# Altium footprint library 3M THD.PcbLib: 163 footprints (part 13 of 14)
Each footprint in its own frame and in the unit in brackets; x right, y up, seen from the top. Pads: shape width x height; smd on the part's side, far side on the other; paste and mask are expansions set on the pad; w line width, h text height; cw(c..) or ccw(c..) is an arc to the next point about the centre after c.
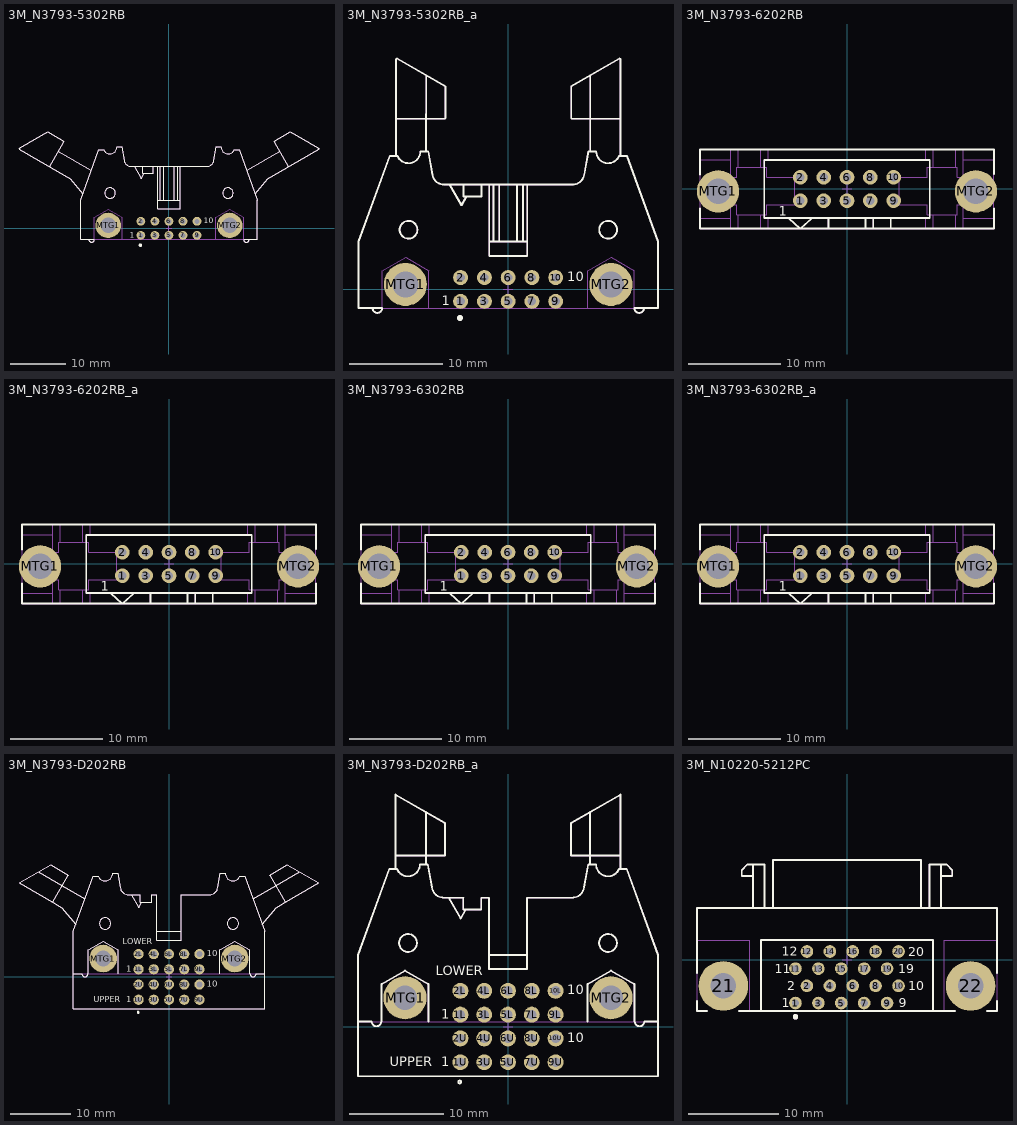
[diagram p12: the footprints below, top view; thin cyan lines are the x and y axes]

## 3M_N3793-5302RB [mm] "3M, 3000 Series, 10 Contacts - Pitch 2.54mm - Right Angle Four-Wall Header (Black) With Long Roll Pin Latch/Ejectors"
height 8.6
pads (12):
  round 1.6 hole 0.9: 1(-5.08,-1.27) 2(-5.08,1.27) 3(-2.54,-1.27) 4(-2.54,1.27) 5(0,-1.27) 6(0,1.27) 7(2.54,-1.27) 8(2.54,1.27) 9(5.08,-1.27) 10(5.08,1.27)
  round 4.6 hole 2.8: MTG1(-10.985,0.53) MTG2(10.985,0.53)
Top Overlay:
  circle w0.2: c10.681,6.375 r0.953
  circle w0.2: c-10.655,6.375 r0.953
  circle w0.35: c-5.153,-3.048 r0.15
  lines w0.2: -21.594,11.145 -19.016,15.611 ccw(c-19.104,15.662) -19.053,15.75 -21.968,17.432 -27.073,14.485 ccw(c-27.022,14.397) -27.073,14.309 -17.886,9.005 -15.575,6.25 ; -19.981,13.939 -14.028,10.502 ; -14.491,-2 ccw(c-13.983,-2) -13.475,-2 ; -13.5,-2.007 -15.989,-2.007 -15.989,5.105 -12.661,14.249 -11.819,14.249 ccw(c-10.655,14.757) -9.385,14.757 -8.543,14.757 -8.101,12.251 ccw(c-6.851,12.471) -6.851,11.201 6.876,11.201 ccw(c6.876,12.471) 8.127,12.251 8.569,14.757 9.411,14.757 ccw(c10.681,14.757) 11.845,14.249 12.687,14.249 16.015,5.105 16.015,-2.007 13.5,-2.007 ; -6.267,11.201 -4.997,9.002 -4.461,9.931 ; -4.769,11.201 -4.769,9.931 -2.851,9.931 -2.851,11.201 ; -2.019,5.105 2.045,5.105 ; -2.019,11.201 -2.019,3.581 2.045,3.581 2.045,11.201 ; -1.587,5.105 -1.587,11.201 -0.953,11.201 -0.953,5.105 ; 0.953,5.105 0.953,11.201 1.587,11.201 1.587,5.105 ; 13.492,-2.007 ccw(c14,-2.007) 14.508,-2.007 ; 14.051,10.502 20.004,13.939 ; 15.598,6.25 17.909,9.005 27.096,14.309 ccw(c27.045,14.397) 27.096,14.485 21.991,17.432 19.076,15.75 ccw(c19.127,15.662) 19.039,15.611 21.617,11.145
  text "10" at 6.34,0.889 h1.02
  text "1" at -7.112,-1.7 h1.02
Mechanical 8:
  lines w0.05: -11.485,0.53 -10.985,0.53 ; -10.985,0.03 -10.985,0.53 ; -10.985,1.03 -10.985,0.53 ; -10.485,0.53 -10.985,0.53 ; -5.58,-1.27 -5.08,-1.27 ; -5.58,1.27 -5.08,1.27 ; -5.08,-1.77 -5.08,-1.27 ; -5.08,-0.77 -5.08,-1.27 ; -5.08,0.77 -5.08,1.27 ; -5.08,1.77 -5.08,1.27 ; -4.58,-1.27 -5.08,-1.27 ; -4.58,1.27 -5.08,1.27 ; -3.04,-1.27 -2.54,-1.27 ; -3.04,1.27 -2.54,1.27 ; -2.54,-1.77 -2.54,-1.27 ; -2.54,-0.77 -2.54,-1.27 ; -2.54,0.77 -2.54,1.27 ; -2.54,1.77 -2.54,1.27 ; -2.04,-1.27 -2.54,-1.27 ; -2.04,1.27 -2.54,1.27 ; -0.5,-1.27 0,-1.27 ; -0.5,0 0,0 ; -0.5,1.27 0,1.27 ; 0,-1.77 0,-1.27 ; 0,-0.77 0,-1.27 ; 0,-0.5 0,0 ; 0,0.5 0,0 ; 0,0.77 0,1.27 ; 0,1.77 0,1.27 ; 0.5,-1.27 0,-1.27 ; 0.5,0 0,0 ; 0.5,1.27 0,1.27 ; 2.04,-1.27 2.54,-1.27 ; 2.04,1.27 2.54,1.27 ; 2.54,-1.77 2.54,-1.27 ; 2.54,-0.77 2.54,-1.27 ; 2.54,0.77 2.54,1.27 ; 2.54,1.77 2.54,1.27 ; 3.04,-1.27 2.54,-1.27 ; 3.04,1.27 2.54,1.27 ; 4.58,-1.27 5.08,-1.27 ; 4.58,1.27 5.08,1.27 ; 5.08,-1.77 5.08,-1.27 ; 5.08,-0.77 5.08,-1.27 ; 5.08,0.77 5.08,1.27 ; 5.08,1.77 5.08,1.27 ; 5.58,-1.27 5.08,-1.27 ; 5.58,1.27 5.08,1.27 ; 10.485,0.53 10.985,0.53 ; 10.985,0.03 10.985,0.53 ; 10.985,1.03 10.985,0.53 ; 11.485,0.53 10.985,0.53
Mechanical 14:
  circle w0.1: c10.681,6.375 r0.953
  circle w0.1: c-10.655,6.375 r0.953
  circle w0.1: c10.998,0.533 r1.27
  circle w0.1: c-10.973,0.533 r1.27
  lines w0.1: -21.594,11.145 -19.016,15.611 ccw(c-19.104,15.662) -19.053,15.75 -21.968,17.432 -27.073,14.485 ccw(c-27.022,14.397) -27.073,14.309 -17.886,9.005 -15.575,6.25 ; -19.981,13.939 -14.028,10.502 ; -16.052,-2.007 16.015,-2.007 16.015,5.105 12.687,14.249 11.845,14.249 cw(c10.681,14.757) 9.411,14.757 8.569,14.757 8.127,12.251 cw(c6.876,12.471) 6.876,11.201 -6.851,11.201 cw(c-6.851,12.471) -8.101,12.251 -8.543,14.757 -9.385,14.757 cw(c-10.655,14.757) -11.819,14.249 -12.661,14.249 -15.989,5.105 -15.989,-2.007 ; -14.491,-2.007 ccw(c-13.983,-2.007) -13.475,-2.007 -13.475,1.978 -10.973,3.422 -8.471,1.978 -8.471,-2.007 ; -6.267,11.201 -4.997,9.002 -4.461,9.931 ; -4.769,11.201 -4.769,9.931 -2.851,9.931 -2.851,11.201 ; -2.019,5.105 2.045,5.105 ; -2.019,11.201 -2.019,3.581 2.045,3.581 2.045,11.201 ; -1.587,5.105 -1.587,11.201 -0.953,11.201 -0.953,5.105 ; 0.953,5.105 0.953,11.201 1.587,11.201 1.587,5.105 ; 8.496,-2.007 8.496,1.978 10.998,3.422 13.5,1.978 13.5,-2.007 ; 13.475,-2.007 ccw(c13.983,-2.007) 14.491,-2.007 ; 13.538,-2.007 ccw(c14.046,-2.007) 14.554,-2.007 ; 14.051,10.502 20.004,13.939 ; 15.598,6.25 17.909,9.005 27.096,14.309 ccw(c27.045,14.397) 27.096,14.485 21.991,17.432 19.076,15.75 ccw(c19.127,15.662) 19.039,15.611 21.617,11.145
  text "1" at -7.112,-1.7 h1.02
  text "10" at 6.34,0.889 h1.02
3D body "3M_N3793-5302RB.stp": height 8.64, standoff -2.84, extent -27.116,-2.514 27.141,17.448

## 3M_N3793-5302RB_a [mm] "3M, 3000 Series, 10 Contacts - Pitch 2.54mm - Right Angle Four-Wall Header (Black) With Long Roll Pin Latch/Ejectors"
height 8.6
pads (12):
  round 1.6 hole 0.9: 1(-5.08,-1.27) 2(-5.08,1.27) 3(-2.54,-1.27) 4(-2.54,1.27) 5(0,-1.27) 6(0,1.27) 7(2.54,-1.27) 8(2.54,1.27) 9(5.08,-1.27) 10(5.08,1.27)
  round 4.6 hole 2.8: MTG1(-10.985,0.53) MTG2(10.985,0.53)
Top Overlay:
  circle w0.2: c-10.655,6.375 r0.953
  circle w0.2: c10.681,6.375 r0.953
  circle w0.35: c-5.153,-3.048 r0.15
  lines w0.2: -14.491,-2 ccw(c-13.983,-2) -13.475,-2 ; -13.513,-2.007 -15.989,-2.007 -15.989,5.105 -12.661,14.249 -11.819,14.249 ccw(c-10.655,14.757) -9.385,14.757 -8.543,14.757 -8.101,12.251 ccw(c-6.851,12.471) -6.851,11.201 6.876,11.201 ccw(c6.876,12.471) 8.127,12.251 8.569,14.757 9.411,14.757 ccw(c10.681,14.757) 11.845,14.249 12.687,14.249 16.015,5.105 16.015,-2.007 13.5,-2.007 ; -11.976,14.249 -11.976,24.561 cw(c-11.874,24.561) -11.824,24.649 -6.718,21.702 -6.718,18.336 cw(c-6.82,18.336) -6.82,18.235 -11.976,18.235 ; -8.774,14.757 -8.75,22.875 ; -6.267,11.201 -4.997,9.002 -4.461,9.931 ; -4.769,11.201 -4.769,9.931 -2.851,9.931 -2.851,11.201 ; -2.019,5.105 2.045,5.105 ; -2.019,11.201 -2.019,3.581 2.045,3.581 2.045,11.201 ; -1.587,5.105 -1.587,11.201 -0.953,11.201 -0.953,5.105 ; 0.953,5.105 0.953,11.201 1.587,11.201 1.587,5.105 ; 8.776,14.757 8.776,22.875 ; 12.002,14.249 12.002,24.561 ccw(c11.9,24.561) 11.849,24.649 6.744,21.702 6.744,18.336 ccw(c6.845,18.336) 6.845,18.235 12.002,18.235 ; 13.492,-2.007 ccw(c14,-2.007) 14.508,-2.007
  text "1" at -7.112,-1.7 h1.02
  text "10" at 6.34,0.889 h1.02
Mechanical 8:
  lines w0.05: -11.485,0.53 -10.985,0.53 ; -10.985,0.03 -10.985,0.53 ; -10.985,1.03 -10.985,0.53 ; -10.485,0.53 -10.985,0.53 ; -5.58,-1.27 -5.08,-1.27 ; -5.58,1.27 -5.08,1.27 ; -5.08,-1.77 -5.08,-1.27 ; -5.08,-0.77 -5.08,-1.27 ; -5.08,0.77 -5.08,1.27 ; -5.08,1.77 -5.08,1.27 ; -4.58,-1.27 -5.08,-1.27 ; -4.58,1.27 -5.08,1.27 ; -3.04,-1.27 -2.54,-1.27 ; -3.04,1.27 -2.54,1.27 ; -2.54,-1.77 -2.54,-1.27 ; -2.54,-0.77 -2.54,-1.27 ; -2.54,0.77 -2.54,1.27 ; -2.54,1.77 -2.54,1.27 ; -2.04,-1.27 -2.54,-1.27 ; -2.04,1.27 -2.54,1.27 ; -0.5,-1.27 0,-1.27 ; -0.5,0 0,0 ; -0.5,1.27 0,1.27 ; 0,-1.77 0,-1.27 ; 0,-0.77 0,-1.27 ; 0,-0.5 0,0 ; 0,0.5 0,0 ; 0,0.77 0,1.27 ; 0,1.77 0,1.27 ; 0.5,-1.27 0,-1.27 ; 0.5,0 0,0 ; 0.5,1.27 0,1.27 ; 2.04,-1.27 2.54,-1.27 ; 2.04,1.27 2.54,1.27 ; 2.54,-1.77 2.54,-1.27 ; 2.54,-0.77 2.54,-1.27 ; 2.54,0.77 2.54,1.27 ; 2.54,1.77 2.54,1.27 ; 3.04,-1.27 2.54,-1.27 ; 3.04,1.27 2.54,1.27 ; 4.58,-1.27 5.08,-1.27 ; 4.58,1.27 5.08,1.27 ; 5.08,-1.77 5.08,-1.27 ; 5.08,-0.77 5.08,-1.27 ; 5.08,0.77 5.08,1.27 ; 5.08,1.77 5.08,1.27 ; 5.58,-1.27 5.08,-1.27 ; 5.58,1.27 5.08,1.27 ; 10.485,0.53 10.985,0.53 ; 10.985,0.03 10.985,0.53 ; 10.985,1.03 10.985,0.53 ; 11.485,0.53 10.985,0.53
Mechanical 14:
  circle w0.1: c-10.973,0.533 r1.27
  circle w0.1: c10.998,0.533 r1.27
  circle w0.1: c-10.655,6.375 r0.953
  circle w0.1: c10.681,6.375 r0.953
  lines w0.1: -16.052,-2.007 16.015,-2.007 16.015,5.105 12.687,14.249 11.845,14.249 cw(c10.681,14.757) 9.411,14.757 8.569,14.757 8.127,12.251 cw(c6.876,12.471) 6.876,11.201 -6.851,11.201 cw(c-6.851,12.471) -8.101,12.251 -8.543,14.757 -9.385,14.757 cw(c-10.655,14.757) -11.819,14.249 -12.661,14.249 -15.989,5.105 -15.989,-2.007 ; -14.491,-2.007 ccw(c-13.983,-2.007) -13.475,-2.007 -13.475,1.978 -10.973,3.422 -8.471,1.978 -8.471,-2.007 ; -11.976,14.249 -11.976,24.561 cw(c-11.874,24.561) -11.824,24.649 -6.718,21.702 -6.718,18.336 cw(c-6.82,18.336) -6.82,18.235 -11.976,18.235 ; -8.774,14.757 -8.75,22.875 ; -6.267,11.201 -4.997,9.002 -4.461,9.931 ; -4.769,11.201 -4.769,9.931 -2.851,9.931 -2.851,11.201 ; -4.559,-2.007 7.125,-2.007 ; -2.019,5.105 2.045,5.105 ; -2.019,11.201 -2.019,3.581 2.045,3.581 2.045,11.201 ; -1.587,5.105 -1.587,11.201 -0.953,11.201 -0.953,5.105 ; 0.953,5.105 0.953,11.201 1.587,11.201 1.587,5.105 ; 8.496,-2.007 8.496,1.978 10.998,3.422 13.5,1.978 13.5,-2.007 ; 8.776,14.757 8.776,22.875 ; 12.002,14.249 12.002,24.561 ccw(c11.9,24.561) 11.849,24.649 6.744,21.702 6.744,18.336 ccw(c6.845,18.336) 6.845,18.235 12.002,18.235 ; 13.475,-2.007 ccw(c13.983,-2.007) 14.491,-2.007 ; 13.538,-2.007 ccw(c14.046,-2.007) 14.554,-2.007
  text "10" at 6.34,0.889 h1.02
  text "1" at -7.112,-1.7 h1.02
3D body "3M_N3793-5302RB_a.stp": height 8.64, standoff -2.84, extent -16.002,-2.514 16.002,24.674

## 3M_N3793-6202RB [mm] "3M, 3000 Series, 10 Contacts - Pitch 2.54mm - Straight Four-Wall Header (Black) With Short Roll Pin Latch/Ejectors"
height 24.6
pads (12):
  round 1.6 hole 0.9: 1(-5.08,-1.27) 2(-5.08,1.27) 3(-2.54,-1.27) 4(-2.54,1.27) 5(0,-1.27) 6(0,1.27) 7(2.54,-1.27) 8(2.54,1.27) 9(5.08,-1.27) 10(5.08,1.27)
  round 4.6 hole 2.8: MTG1(-14.034,-0.256) MTG2(14.034,-0.252)
Top Overlay:
  lines w0.2: -15.998,-2.109 -15.998,-4.318 15.998,-4.318 15.998,-2.104 ; -15.998,1.596 -15.998,4.318 15.998,4.318 15.998,1.601 ; -6.35,-3.175 -5.08,-4.318 -3.81,-3.175 ; -2.03,-4.318 -2.03,-3.174 ; 2.032,-4.318 2.032,-3.174 ; 2.851,-4.318 2.851,-3.174 ; 4.767,-4.318 4.767,-3.174 ; -9.015,-3.174 -9.015,3.176 9.015,3.176 9.015,-3.174 -9.015,-3.174
  text "1" at -7.417,-2.921 h1.02
Mechanical 8:
  lines w0.1: -14.534,-0.256 -14.034,-0.256 ; -14.034,-0.756 -14.034,-0.256 ; -14.034,0.244 -14.034,-0.256 ; -13.534,-0.256 -14.034,-0.256 ; -5.58,-1.27 -5.08,-1.27 ; -5.58,1.27 -5.08,1.27 ; -5.08,-1.77 -5.08,-1.27 ; -5.08,-0.77 -5.08,-1.27 ; -5.08,0.77 -5.08,1.27 ; -5.08,1.77 -5.08,1.27 ; -4.58,-1.27 -5.08,-1.27 ; -4.58,1.27 -5.08,1.27 ; -3.04,-1.27 -2.54,-1.27 ; -3.04,1.27 -2.54,1.27 ; -2.54,-1.77 -2.54,-1.27 ; -2.54,-0.77 -2.54,-1.27 ; -2.54,0.77 -2.54,1.27 ; -2.54,1.77 -2.54,1.27 ; -2.04,-1.27 -2.54,-1.27 ; -2.04,1.27 -2.54,1.27 ; -0.5,-1.27 0,-1.27 ; -0.5,0 0,0 ; -0.5,1.27 0,1.27 ; 0,-1.77 0,-1.27 ; 0,-0.77 0,-1.27 ; 0,-0.5 0,0 ; 0,0.5 0,0 ; 0,0.77 0,1.27 ; 0,1.77 0,1.27 ; 0.5,-1.27 0,-1.27 ; 0.5,0 0,0 ; 0.5,1.27 0,1.27 ; 2.04,-1.27 2.54,-1.27 ; 2.04,1.27 2.54,1.27 ; 2.54,-1.77 2.54,-1.27 ; 2.54,-0.77 2.54,-1.27 ; 2.54,0.77 2.54,1.27 ; 2.54,1.77 2.54,1.27 ; 3.04,-1.27 2.54,-1.27 ; 3.04,1.27 2.54,1.27 ; 4.58,-1.27 5.08,-1.27 ; 4.58,1.27 5.08,1.27 ; 5.08,-1.77 5.08,-1.27 ; 5.08,-0.77 5.08,-1.27 ; 5.08,0.77 5.08,1.27 ; 5.08,1.77 5.08,1.27 ; 5.58,-1.27 5.08,-1.27 ; 5.58,1.27 5.08,1.27 ; 13.534,-0.252 14.034,-0.252 ; 14.034,-0.752 14.034,-0.252 ; 14.034,0.248 14.034,-0.252 ; 14.534,-0.252 14.034,-0.252
Mechanical 14:
  lines w0.1: -15.998,-4.318 -15.998,4.318 ; -15.998,-4.318 15.998,-4.318 ; -15.998,-4.318 -15.998,4.318 ; -15.998,-4.318 15.998,-4.318 ; -15.998,4.318 15.998,4.318 ; -15.998,4.318 15.998,4.318 ; -15.553,-1.133 -15.553,0.628 ; -15.553,-1.133 -14.719,-1.615 -15.553,-1.133 ; -15.553,-1.133 -15.553,0.628 ; -15.553,0.628 -14.719,1.109 -15.553,0.628 ; -14.719,-1.727 -14.719,1.271 ; -14.719,-1.727 -11.985,-1.727 ; -14.719,-1.727 -14.719,1.271 ; -14.719,-1.727 -11.985,-1.727 ; -14.719,1.271 -11.985,1.271 ; -14.719,1.271 -11.985,1.271 ; -14.031,-2.014 -14.526,-1.727 -14.031,-2.014 ; -14.031,-2.014 -13.535,-1.727 -14.031,-2.014 ; -14.031,1.507 -13.622,1.271 -14.031,1.507 ; -14.031,1.507 -14.439,1.271 -14.031,1.507 ; -11.985,-2.819 -11.985,-1.727 ; -11.985,-2.819 -8.759,-2.819 ; -11.985,-2.819 -11.985,-1.727 ; -11.985,-2.819 -8.759,-2.819 ; -11.985,1.271 -11.985,2.362 ; -11.985,1.271 -11.985,2.362 ; -11.985,2.362 -8.763,2.362 -11.985,2.362 ; -9.015,-3.174 9.015,-3.174 ; -9.015,-3.174 -9.015,-2.819 -9.015,-3.174 ; -9.015,-3.174 9.015,-3.174 ; -9.015,3.176 9.015,3.176 ; -9.015,3.176 -9.015,2.362 -9.015,3.176 ; -9.015,3.176 9.015,3.176 ; -8.759,-2.819 -8.759,-1.727 ; -8.759,-2.819 -8.759,-1.727 ; -8.759,-1.727 -5.713,-1.727 ; -8.759,-1.727 -5.713,-1.727 ; -8.759,1.271 -8.759,2.362 -8.759,1.271 ; -8.759,1.271 -5.713,1.271 ; -8.759,1.271 -5.713,1.271 ; -5.713,-1.727 -5.713,1.271 ; -5.713,-1.727 -5.713,1.271 ; 5.713,-1.727 5.713,1.271 ; 5.713,-1.727 8.759,-1.727 ; 5.713,-1.727 5.713,1.271 ; 5.713,-1.727 8.759,-1.727 ; 5.713,1.271 8.759,1.271 ; 5.713,1.271 8.759,1.271 ; 8.759,-2.819 8.759,-1.727 ; 8.759,-2.819 11.985,-2.819 ; 8.759,-2.819 8.759,-1.727 ; 8.759,-2.819 11.985,-2.819 ; 8.759,1.271 8.759,2.362 ; 8.759,1.271 8.759,2.362 ; 8.759,2.362 11.985,2.362 ; 8.759,2.362 11.985,2.362 ; 9.015,-3.174 9.015,-2.819 9.015,-3.174 ; 9.015,3.176 9.015,2.362 9.015,3.176 ; 11.985,-2.819 11.985,-1.727 ; 11.985,-2.819 11.985,-1.727 ; 11.985,-1.727 14.719,-1.727 ; 11.985,-1.727 14.719,-1.727 ; 11.985,1.271 11.985,2.362 ; 11.985,1.271 14.719,1.271 ; 11.985,1.271 11.985,2.362 ; 11.985,1.271 14.719,1.271 ; 14.031,-2.014 14.526,-1.727 14.031,-2.014 ; 14.031,-2.014 13.535,-1.727 14.031,-2.014 ; 14.031,1.507 13.622,1.271 14.031,1.507 ; 14.031,1.507 14.439,1.271 14.031,1.507 ; 14.719,-1.727 14.719,1.271 ; 14.719,-1.727 14.719,1.271 ; 15.553,-1.133 15.553,0.628 ; 15.553,-1.133 14.719,-1.615 15.553,-1.133 ; 15.553,-1.133 15.553,0.628 ; 15.553,0.628 14.719,1.109 15.553,0.628 ; 15.998,-4.318 15.998,4.318 ; 15.998,-4.318 15.998,4.318 ; -15.998,-3.174 -12.67,-3.174 -15.998,-3.174 ; -15.998,3.176 -12.67,3.176 -15.998,3.176 ; -12.67,-4.318 -12.67,-1.727 -12.67,-4.318 ; -12.67,1.271 -12.67,4.318 -12.67,1.271 ; -11.831,-4.318 -11.831,-2.819 -11.831,-4.318 ; -11.831,2.362 -11.831,4.318 -11.831,2.362 ; -9.395,-4.318 -9.395,-2.819 -9.395,-4.318 ; -9.395,2.362 -9.395,4.318 -9.395,2.362 ; -8.553,-4.318 -8.553,-3.174 -8.553,-4.318 ; -8.553,3.176 -8.553,4.318 -8.553,3.176 ; -2.03,-4.318 -2.03,-3.174 -2.03,-4.318 ; 2.032,-4.318 2.032,-3.174 2.032,-4.318 ; 2.851,-4.318 2.851,-3.174 2.851,-4.318 ; 4.767,-4.318 4.767,-3.174 4.767,-4.318 ; 8.553,-4.318 8.553,-3.174 8.553,-4.318 ; 8.553,3.176 8.553,4.318 8.553,3.176 ; 9.395,-4.318 9.395,-2.819 9.395,-4.318 ; 9.395,2.362 9.395,4.318 9.395,2.362 ; 11.831,-4.318 11.831,-2.819 11.831,-4.318 ; 11.831,2.362 11.831,4.318 11.831,2.362 ; 12.67,-4.318 12.67,-1.727 12.67,-4.318 ; 12.67,-3.174 15.998,-3.174 12.67,-3.174 ; 12.67,1.271 12.67,4.318 12.67,1.271 ; 12.67,3.176 15.998,3.176 12.67,3.176
3D body "3M_N3793-6202RB.stp": height 18.69, standoff -2.84, extent -24.931,-4.318 24.931,4.318

## 3M_N3793-6202RB_a [mm] "3M, 3000 Series, 10 Contacts - Pitch 2.54mm - Straight Four-Wall Header (Black) With Short Roll Pin Latch/Ejectors"
height 24.6
pads (12):
  round 1.6 hole 0.9: 1(-5.08,-1.27) 2(-5.08,1.27) 3(-2.54,-1.27) 4(-2.54,1.27) 5(0,-1.27) 6(0,1.27) 7(2.54,-1.27) 8(2.54,1.27) 9(5.08,-1.27) 10(5.08,1.27)
  round 4.6 hole 2.8: MTG1(-14.034,-0.256) MTG2(14.034,-0.252)
Top Overlay:
  lines w0.2: -15.998,-2.109 -15.998,-4.318 15.998,-4.318 15.998,-2.104 ; -15.998,1.596 -15.998,4.318 15.998,4.318 15.998,1.601 ; -6.35,-3.175 -5.08,-4.318 -3.81,-3.175 ; -2.03,-4.318 -2.03,-3.174 ; 2.032,-4.318 2.032,-3.174 ; 2.851,-4.318 2.851,-3.174 ; 4.767,-4.318 4.767,-3.174 ; -9.015,-3.174 -9.015,3.176 9.015,3.176 9.015,-3.174 -9.015,-3.174
  text "1" at -7.417,-2.921 h1.02
Mechanical 8:
  lines w0.1: -14.534,-0.256 -14.034,-0.256 ; -14.034,-0.756 -14.034,-0.256 ; -14.034,0.244 -14.034,-0.256 ; -13.534,-0.256 -14.034,-0.256 ; -5.58,-1.27 -5.08,-1.27 ; -5.58,1.27 -5.08,1.27 ; -5.08,-1.77 -5.08,-1.27 ; -5.08,-0.77 -5.08,-1.27 ; -5.08,0.77 -5.08,1.27 ; -5.08,1.77 -5.08,1.27 ; -4.58,-1.27 -5.08,-1.27 ; -4.58,1.27 -5.08,1.27 ; -3.04,-1.27 -2.54,-1.27 ; -3.04,1.27 -2.54,1.27 ; -2.54,-1.77 -2.54,-1.27 ; -2.54,-0.77 -2.54,-1.27 ; -2.54,0.77 -2.54,1.27 ; -2.54,1.77 -2.54,1.27 ; -2.04,-1.27 -2.54,-1.27 ; -2.04,1.27 -2.54,1.27 ; -0.5,-1.27 0,-1.27 ; -0.5,0 0,0 ; -0.5,1.27 0,1.27 ; 0,-1.77 0,-1.27 ; 0,-0.77 0,-1.27 ; 0,-0.5 0,0 ; 0,0.5 0,0 ; 0,0.77 0,1.27 ; 0,1.77 0,1.27 ; 0.5,-1.27 0,-1.27 ; 0.5,0 0,0 ; 0.5,1.27 0,1.27 ; 2.04,-1.27 2.54,-1.27 ; 2.04,1.27 2.54,1.27 ; 2.54,-1.77 2.54,-1.27 ; 2.54,-0.77 2.54,-1.27 ; 2.54,0.77 2.54,1.27 ; 2.54,1.77 2.54,1.27 ; 3.04,-1.27 2.54,-1.27 ; 3.04,1.27 2.54,1.27 ; 4.58,-1.27 5.08,-1.27 ; 4.58,1.27 5.08,1.27 ; 5.08,-1.77 5.08,-1.27 ; 5.08,-0.77 5.08,-1.27 ; 5.08,0.77 5.08,1.27 ; 5.08,1.77 5.08,1.27 ; 5.58,-1.27 5.08,-1.27 ; 5.58,1.27 5.08,1.27 ; 13.534,-0.252 14.034,-0.252 ; 14.034,-0.752 14.034,-0.252 ; 14.034,0.248 14.034,-0.252 ; 14.534,-0.252 14.034,-0.252
Mechanical 14:
  lines w0.1: -15.998,-4.318 -15.998,4.318 ; -15.998,-4.318 15.998,-4.318 ; -15.998,-4.318 -15.998,4.318 ; -15.998,-4.318 15.998,-4.318 ; -15.998,4.318 15.998,4.318 ; -15.998,4.318 15.998,4.318 ; -15.553,-1.133 -15.553,0.628 ; -15.553,-1.133 -14.719,-1.615 -15.553,-1.133 ; -15.553,-1.133 -15.553,0.628 ; -15.553,0.628 -14.719,1.109 -15.553,0.628 ; -14.719,-1.727 -14.719,1.271 ; -14.719,-1.727 -11.985,-1.727 ; -14.719,-1.727 -14.719,1.271 ; -14.719,-1.727 -11.985,-1.727 ; -14.719,1.271 -11.985,1.271 ; -14.719,1.271 -11.985,1.271 ; -14.031,-2.014 -14.526,-1.727 -14.031,-2.014 ; -14.031,-2.014 -13.535,-1.727 -14.031,-2.014 ; -14.031,1.507 -13.622,1.271 -14.031,1.507 ; -14.031,1.507 -14.439,1.271 -14.031,1.507 ; -11.985,-2.819 -11.985,-1.727 ; -11.985,-2.819 -8.759,-2.819 ; -11.985,-2.819 -11.985,-1.727 ; -11.985,-2.819 -8.759,-2.819 ; -11.985,1.271 -11.985,2.362 ; -11.985,1.271 -11.985,2.362 ; -11.985,2.362 -8.763,2.362 -11.985,2.362 ; -9.015,-3.174 9.015,-3.174 ; -9.015,-3.174 -9.015,-2.819 -9.015,-3.174 ; -9.015,-3.174 9.015,-3.174 ; -9.015,3.176 9.015,3.176 ; -9.015,3.176 -9.015,2.362 -9.015,3.176 ; -9.015,3.176 9.015,3.176 ; -8.759,-2.819 -8.759,-1.727 ; -8.759,-2.819 -8.759,-1.727 ; -8.759,-1.727 -5.713,-1.727 ; -8.759,-1.727 -5.713,-1.727 ; -8.759,1.271 -8.759,2.362 -8.759,1.271 ; -8.759,1.271 -5.713,1.271 ; -8.759,1.271 -5.713,1.271 ; -5.713,-1.727 -5.713,1.271 ; -5.713,-1.727 -5.713,1.271 ; 5.713,-1.727 5.713,1.271 ; 5.713,-1.727 8.759,-1.727 ; 5.713,-1.727 5.713,1.271 ; 5.713,-1.727 8.759,-1.727 ; 5.713,1.271 8.759,1.271 ; 5.713,1.271 8.759,1.271 ; 8.759,-2.819 8.759,-1.727 ; 8.759,-2.819 11.985,-2.819 ; 8.759,-2.819 8.759,-1.727 ; 8.759,-2.819 11.985,-2.819 ; 8.759,1.271 8.759,2.362 ; 8.759,1.271 8.759,2.362 ; 8.759,2.362 11.985,2.362 ; 8.759,2.362 11.985,2.362 ; 9.015,-3.174 9.015,-2.819 9.015,-3.174 ; 9.015,3.176 9.015,2.362 9.015,3.176 ; 11.985,-2.819 11.985,-1.727 ; 11.985,-2.819 11.985,-1.727 ; 11.985,-1.727 14.719,-1.727 ; 11.985,-1.727 14.719,-1.727 ; 11.985,1.271 11.985,2.362 ; 11.985,1.271 14.719,1.271 ; 11.985,1.271 11.985,2.362 ; 11.985,1.271 14.719,1.271 ; 14.031,-2.014 14.526,-1.727 14.031,-2.014 ; 14.031,-2.014 13.535,-1.727 14.031,-2.014 ; 14.031,1.507 13.622,1.271 14.031,1.507 ; 14.031,1.507 14.439,1.271 14.031,1.507 ; 14.719,-1.727 14.719,1.271 ; 14.719,-1.727 14.719,1.271 ; 15.553,-1.133 15.553,0.628 ; 15.553,-1.133 14.719,-1.615 15.553,-1.133 ; 15.553,-1.133 15.553,0.628 ; 15.553,0.628 14.719,1.109 15.553,0.628 ; 15.998,-4.318 15.998,4.318 ; 15.998,-4.318 15.998,4.318 ; -15.998,-3.174 -12.67,-3.174 -15.998,-3.174 ; -15.998,3.176 -12.67,3.176 -15.998,3.176 ; -12.67,-4.318 -12.67,-1.727 -12.67,-4.318 ; -12.67,1.271 -12.67,4.318 -12.67,1.271 ; -11.831,-4.318 -11.831,-2.819 -11.831,-4.318 ; -11.831,2.362 -11.831,4.318 -11.831,2.362 ; -9.395,-4.318 -9.395,-2.819 -9.395,-4.318 ; -9.395,2.362 -9.395,4.318 -9.395,2.362 ; -8.553,-4.318 -8.553,-3.174 -8.553,-4.318 ; -8.553,3.176 -8.553,4.318 -8.553,3.176 ; -2.03,-4.318 -2.03,-3.174 -2.03,-4.318 ; 2.032,-4.318 2.032,-3.174 2.032,-4.318 ; 2.851,-4.318 2.851,-3.174 2.851,-4.318 ; 4.767,-4.318 4.767,-3.174 4.767,-4.318 ; 8.553,-4.318 8.553,-3.174 8.553,-4.318 ; 8.553,3.176 8.553,4.318 8.553,3.176 ; 9.395,-4.318 9.395,-2.819 9.395,-4.318 ; 9.395,2.362 9.395,4.318 9.395,2.362 ; 11.831,-4.318 11.831,-2.819 11.831,-4.318 ; 11.831,2.362 11.831,4.318 11.831,2.362 ; 12.67,-4.318 12.67,-1.727 12.67,-4.318 ; 12.67,-3.174 15.998,-3.174 12.67,-3.174 ; 12.67,1.271 12.67,4.318 12.67,1.271 ; 12.67,3.176 15.998,3.176 12.67,3.176
3D body "3M_N3793-6202RB_a.stp": height 24.64, standoff -2.84, extent -16.002,-4.318 16.002,4.318

## 3M_N3793-6302RB [mm] "3M, 3000 Series, 10 Contacts - Pitch 2.54mm - Straight Four-Wall Header (Black) With Long Roll Pin Latch/Ejectors"
height 27.2
pads (12):
  round 1.6 hole 0.9: 1(-5.08,-1.27) 2(-5.08,1.27) 3(-2.54,-1.27) 4(-2.54,1.27) 5(0,-1.27) 6(0,1.27) 7(2.54,-1.27) 8(2.54,1.27) 9(5.08,-1.27) 10(5.08,1.27)
  round 4.6 hole 2.8: MTG1(-14.034,-0.256) MTG2(14.034,-0.252)
Top Overlay:
  lines w0.2: -15.998,-2.109 -15.998,-4.318 15.998,-4.318 15.998,-2.104 ; -15.998,1.596 -15.998,4.318 15.998,4.318 15.998,1.601 ; -6.35,-3.175 -5.08,-4.318 -3.81,-3.175 ; -2.03,-4.318 -2.03,-3.174 ; 2.032,-4.318 2.032,-3.174 ; 2.851,-4.318 2.851,-3.174 ; 4.767,-4.318 4.767,-3.174 ; -9.015,-3.174 9.015,-3.174 9.015,3.176 -9.015,3.176 -9.015,-3.174
  text "1" at -7.417,-2.921 h1.02
Mechanical 8:
  lines w0.1: -14.534,-0.256 -14.034,-0.256 ; -14.034,-0.756 -14.034,-0.256 ; -14.034,0.244 -14.034,-0.256 ; -13.534,-0.256 -14.034,-0.256 ; -5.58,-1.27 -5.08,-1.27 ; -5.58,1.27 -5.08,1.27 ; -5.08,-1.77 -5.08,-1.27 ; -5.08,-0.77 -5.08,-1.27 ; -5.08,0.77 -5.08,1.27 ; -5.08,1.77 -5.08,1.27 ; -4.58,-1.27 -5.08,-1.27 ; -4.58,1.27 -5.08,1.27 ; -3.04,-1.27 -2.54,-1.27 ; -3.04,1.27 -2.54,1.27 ; -2.54,-1.77 -2.54,-1.27 ; -2.54,-0.77 -2.54,-1.27 ; -2.54,0.77 -2.54,1.27 ; -2.54,1.77 -2.54,1.27 ; -2.04,-1.27 -2.54,-1.27 ; -2.04,1.27 -2.54,1.27 ; -0.5,-1.27 0,-1.27 ; -0.5,0 0,0 ; -0.5,1.27 0,1.27 ; 0,-1.77 0,-1.27 ; 0,-0.77 0,-1.27 ; 0,-0.5 0,0 ; 0,0.5 0,0 ; 0,0.77 0,1.27 ; 0,1.77 0,1.27 ; 0.5,-1.27 0,-1.27 ; 0.5,0 0,0 ; 0.5,1.27 0,1.27 ; 2.04,-1.27 2.54,-1.27 ; 2.04,1.27 2.54,1.27 ; 2.54,-1.77 2.54,-1.27 ; 2.54,-0.77 2.54,-1.27 ; 2.54,0.77 2.54,1.27 ; 2.54,1.77 2.54,1.27 ; 3.04,-1.27 2.54,-1.27 ; 3.04,1.27 2.54,1.27 ; 4.58,-1.27 5.08,-1.27 ; 4.58,1.27 5.08,1.27 ; 5.08,-1.77 5.08,-1.27 ; 5.08,-0.77 5.08,-1.27 ; 5.08,0.77 5.08,1.27 ; 5.08,1.77 5.08,1.27 ; 5.58,-1.27 5.08,-1.27 ; 5.58,1.27 5.08,1.27 ; 13.534,-0.252 14.034,-0.252 ; 14.034,-0.752 14.034,-0.252 ; 14.034,0.248 14.034,-0.252 ; 14.534,-0.252 14.034,-0.252
Mechanical 14:
  lines w0.1: -15.998,-4.318 15.998,-4.318 ; -15.998,-4.318 -15.998,4.318 ; -15.998,-4.318 15.998,-4.318 ; -15.998,-4.318 -15.998,4.318 ; -15.998,4.318 15.998,4.318 ; -15.998,4.318 15.998,4.318 ; -15.553,-1.133 -14.719,-1.615 -15.553,-1.133 ; -15.553,-1.133 -15.553,0.628 ; -15.553,-1.133 -15.553,0.628 ; -15.553,0.628 -14.719,1.109 -15.553,0.628 ; -14.719,-1.727 -11.985,-1.727 ; -14.719,-1.727 -14.719,1.271 ; -14.719,-1.727 -11.985,-1.727 ; -14.719,-1.727 -14.719,1.271 ; -14.719,1.271 -11.985,1.271 ; -14.719,1.271 -11.985,1.271 ; -14.031,-2.014 -13.535,-1.727 -14.031,-2.014 ; -14.031,-2.014 -14.526,-1.727 -14.031,-2.014 ; -14.031,1.507 -14.439,1.271 -14.031,1.507 ; -14.031,1.507 -13.622,1.271 -14.031,1.507 ; -11.985,-2.819 -8.759,-2.819 ; -11.985,-2.819 -11.985,-1.727 ; -11.985,-2.819 -8.759,-2.819 ; -11.985,-2.819 -11.985,-1.727 ; -11.985,1.271 -11.985,2.362 ; -11.985,1.271 -11.985,2.362 ; -11.985,2.362 -8.763,2.362 -11.985,2.362 ; -9.015,-3.174 -9.015,-2.819 -9.015,-3.174 ; -9.015,-3.174 9.015,-3.174 ; -9.015,-3.174 9.015,-3.174 ; -9.015,3.176 -9.015,2.362 -9.015,3.176 ; -9.015,3.176 9.015,3.176 ; -9.015,3.176 9.015,3.176 ; -8.759,-2.819 -8.759,-1.727 ; -8.759,-2.819 -8.759,-1.727 ; -8.759,-1.727 -5.713,-1.727 ; -8.759,-1.727 -5.713,-1.727 ; -8.759,1.271 -5.713,1.271 ; -8.759,1.271 -8.759,2.362 -8.759,1.271 ; -8.759,1.271 -5.713,1.271 ; -5.713,-1.727 -5.713,1.271 ; -5.713,-1.727 -5.713,1.271 ; 5.713,-1.727 8.759,-1.727 ; 5.713,-1.727 5.713,1.271 ; 5.713,-1.727 8.759,-1.727 ; 5.713,-1.727 5.713,1.271 ; 5.713,1.271 8.759,1.271 ; 5.713,1.271 8.759,1.271 ; 8.759,-2.819 11.985,-2.819 ; 8.759,-2.819 8.759,-1.727 ; 8.759,-2.819 11.985,-2.819 ; 8.759,-2.819 8.759,-1.727 ; 8.759,1.271 8.759,2.362 ; 8.759,1.271 8.759,2.362 ; 8.759,2.362 11.985,2.362 ; 8.759,2.362 11.985,2.362 ; 9.015,-3.174 9.015,-2.819 9.015,-3.174 ; 9.015,3.176 9.015,2.362 9.015,3.176 ; 11.985,-2.819 11.985,-1.727 ; 11.985,-2.819 11.985,-1.727 ; 11.985,-1.727 14.719,-1.727 ; 11.985,-1.727 14.719,-1.727 ; 11.985,1.271 14.719,1.271 ; 11.985,1.271 11.985,2.362 ; 11.985,1.271 14.719,1.271 ; 11.985,1.271 11.985,2.362 ; 14.031,-2.014 13.535,-1.727 14.031,-2.014 ; 14.031,-2.014 14.526,-1.727 14.031,-2.014 ; 14.031,1.507 14.439,1.271 14.031,1.507 ; 14.031,1.507 13.622,1.271 14.031,1.507 ; 14.719,-1.727 14.719,1.271 ; 14.719,-1.727 14.719,1.271 ; 15.553,-1.133 14.719,-1.615 15.553,-1.133 ; 15.553,-1.133 15.553,0.628 ; 15.553,-1.133 15.553,0.628 ; 15.553,0.628 14.719,1.109 15.553,0.628 ; 15.998,-4.318 15.998,4.318 ; 15.998,-4.318 15.998,4.318 ; -15.998,-3.174 -12.67,-3.174 -15.998,-3.174 ; -15.998,3.176 -12.67,3.176 -15.998,3.176 ; -12.67,-4.318 -12.67,-1.727 -12.67,-4.318 ; -12.67,1.271 -12.67,4.318 -12.67,1.271 ; -11.831,-4.318 -11.831,-2.819 -11.831,-4.318 ; -11.831,2.362 -11.831,4.318 -11.831,2.362 ; -9.395,-4.318 -9.395,-2.819 -9.395,-4.318 ; -9.395,2.362 -9.395,4.318 -9.395,2.362 ; -8.553,-4.318 -8.553,-3.174 -8.553,-4.318 ; -8.553,3.176 -8.553,4.318 -8.553,3.176 ; -2.03,-4.318 -2.03,-3.174 -2.03,-4.318 ; 2.032,-4.318 2.032,-3.174 2.032,-4.318 ; 2.851,-4.318 2.851,-3.174 2.851,-4.318 ; 4.767,-4.318 4.767,-3.174 4.767,-4.318 ; 8.553,-4.318 8.553,-3.174 8.553,-4.318 ; 8.553,3.176 8.553,4.318 8.553,3.176 ; 9.395,-4.318 9.395,-2.819 9.395,-4.318 ; 9.395,2.362 9.395,4.318 9.395,2.362 ; 11.831,-4.318 11.831,-2.819 11.831,-4.318 ; 11.831,2.362 11.831,4.318 11.831,2.362 ; 12.67,-4.318 12.67,-1.727 12.67,-4.318 ; 12.67,-3.174 15.998,-3.174 12.67,-3.174 ; 12.67,1.271 12.67,4.318 12.67,1.271 ; 12.67,3.176 15.998,3.176 12.67,3.176